# Altium footprint library SMT.PcbLib: 325 footprints (part 9 of 21)
Each footprint in its own frame and in the unit in brackets; x right, y up, seen from the top. Pads: shape width x height; smd on the part's side, far side on the other; paste and mask are expansions set on the pad; w line width, h text height; cw(c..) or ccw(c..) is an arc to the next point about the centre after c.
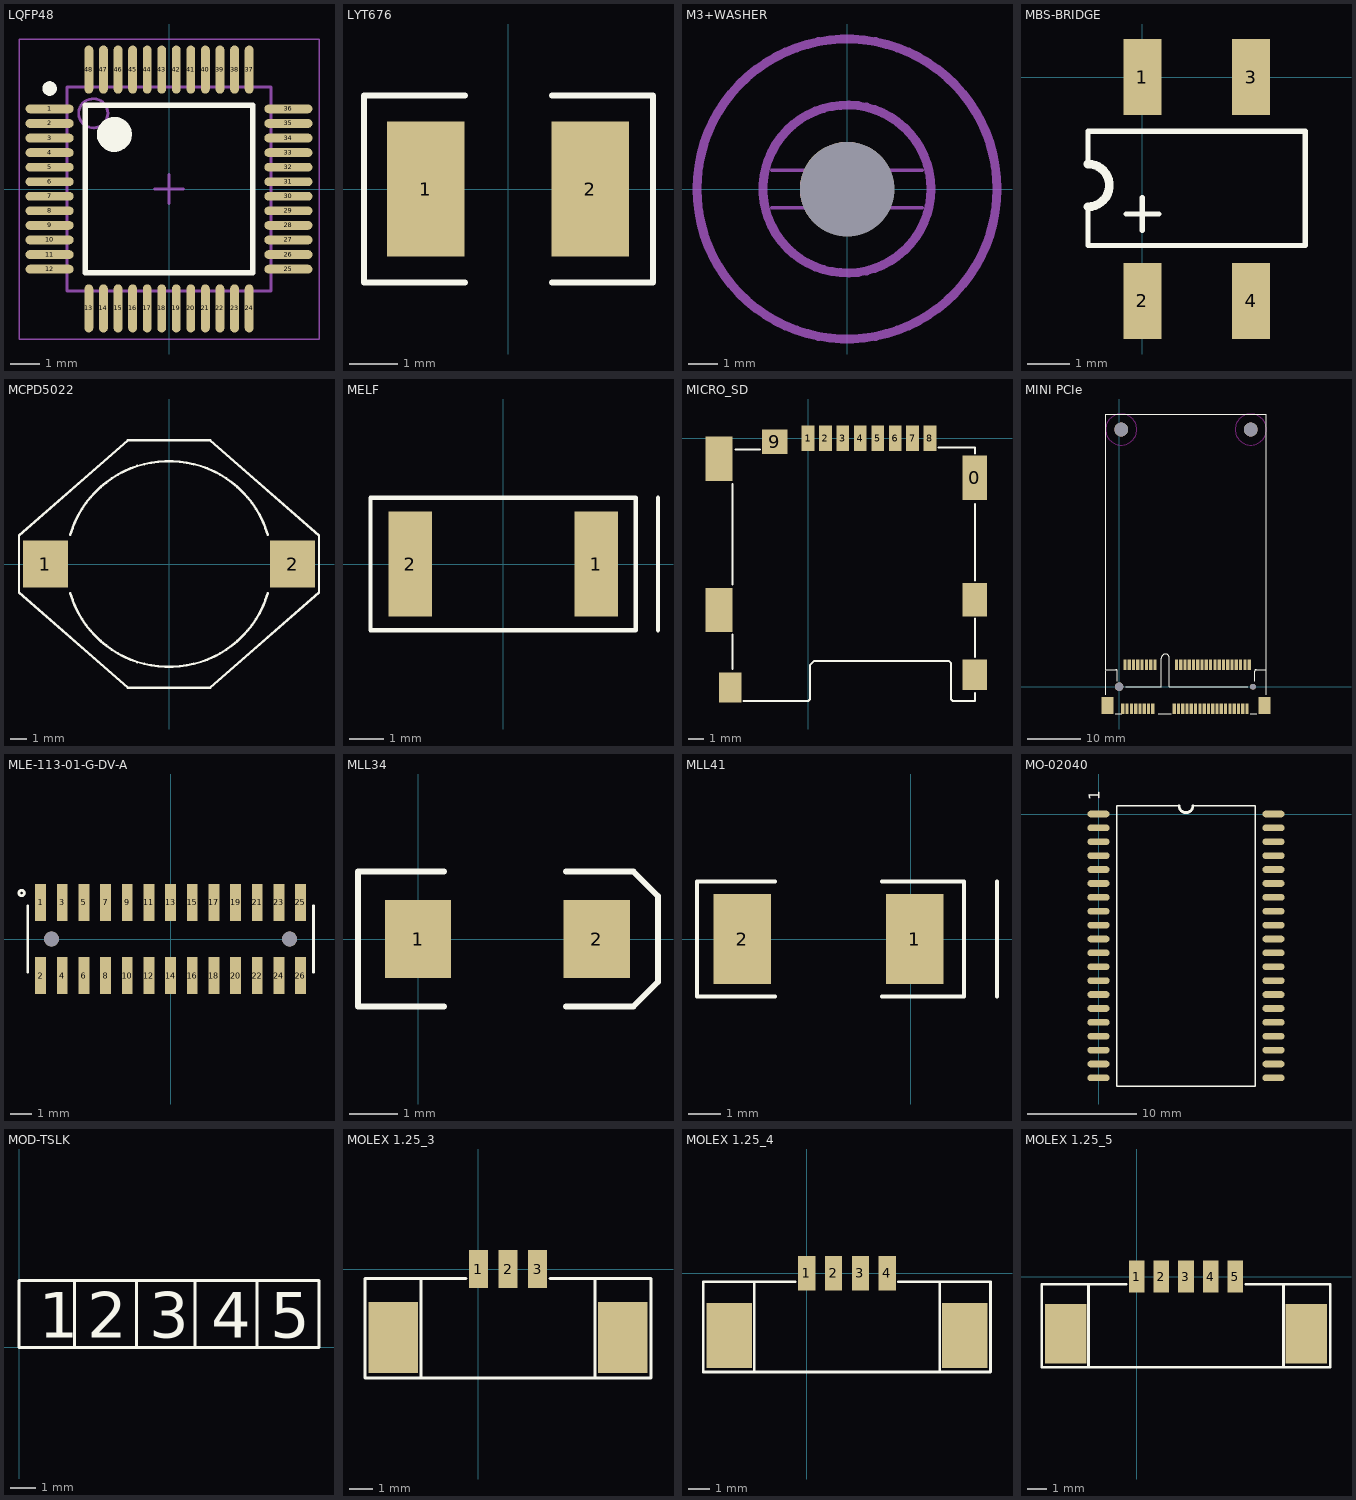
[diagram p8: the footprints below, top view; thin cyan lines are the x and y axes]

## LQFP48 [mm] "TSQFP, 48-Leads, Body 7.00x7.00mm, Pitch 0.50mm, IPC Medium Density"
height 1.5
pads (48):
  oval 1.65x0.3 smd: 1(-4.1,2.75) 2(-4.1,2.25) 3(-4.1,1.75) 4(-4.1,1.25) 5(-4.1,0.75) 6(-4.1,0.25) 7(-4.1,-0.25) 8(-4.1,-0.75) 9(-4.1,-1.25) 10(-4.1,-1.75) 11(-4.1,-2.25) 12(-4.1,-2.75) 25(4.1,-2.75) 26(4.1,-2.25) 27(4.1,-1.75) 28(4.1,-1.25) 29(4.1,-0.75) 30(4.1,-0.25) 31(4.1,0.25) 32(4.1,0.75) 33(4.1,1.25) 34(4.1,1.75) 35(4.1,2.25) 36(4.1,2.75)
  oval 0.3x1.65 smd: 13(-2.75,-4.1) 14(-2.25,-4.1) 15(-1.75,-4.1) 16(-1.25,-4.1) 17(-0.75,-4.1) 18(-0.25,-4.1) 19(0.25,-4.1) 20(0.75,-4.1) 21(1.25,-4.1) 22(1.75,-4.1) 23(2.25,-4.1) 24(2.75,-4.1) 37(2.75,4.1) 38(2.25,4.1) 39(1.75,4.1) 40(1.25,4.1) 41(0.75,4.1) 42(0.25,4.1) 43(-0.25,4.1) 44(-0.75,4.1) 45(-1.25,4.1) 46(-1.75,4.1) 47(-2.25,4.1) 48(-2.75,4.1)
TopOverlay:
  circle w0.6: c-1.875,1.875 r0.3
  circle w0.25: c-4.1,3.45 r0.125
  lines w0.2: -2.875,-2.875 2.875,-2.875 2.875,2.875 -2.875,2.875 -2.875,-2.875
Mechanical13:
  circle w0.1: c-2.6,2.6 r0.5
  lines w0.1: -3.5,-3.5 3.5,-3.5 3.5,3.5 -3.5,3.5 -3.5,-3.5
Mechanical15:
  lines w0.05: -5.15,-5.15 5.15,-5.15 5.15,5.15 -5.15,5.15 -5.15,-5.15
  lines w0.1: -0.5,0 0.5,0 ; 0,-0.5 0,0.5
3D body: height 1.5, standoff 0.05, extent -3.5,-3.5 3.5,3.5

## LYT676 [mil]
pads (2):
  rect 63x110 smd: 1(-67,0) 2(67,0)
TopOverlay:
  lines w5: -35,-76 -117,-76 -117,76 -35,76 ; 36,-76 118,-76 118,76 36,76

## M3+WASHER [mil]
pads (1):
  round 126 hole 126: ""(0,0)
Mechanical2:
  circle w12: c0,0 r112
  circle w12: c0,0 r200
  lines w5: -100,-25 100,-25 ; -100,25 100,25
  text "M3+WASHER" at -238,-275 h52

## MBS-BRIDGE [mil]
pads (4):
  rect 35x70 smd: 1(0,0) 2(0,-206) 3(100,0) 4(100,-206)
TopOverlay:
  lines w5: -50,-120 -50,-155 150,-155 150,-50 -50,-50 -50,-81 ; -15,-126 15,-126 ; 0,-141 0,-111
  lines w8: -50,-119.37 ccw(c-50,-99.69) -50,-80

## MCPD5022 [mm] "INDUCTOR FOOT PRINT"
height 7.11
pads (2):
  rect 2.79x2.92 smd: 1(-7.62,0) 2(7.62,0)
TopOverlay:
  lines w0.152: -6.086,-1.813 ccw(c0,0) 6.086,-1.811 ; -6.086,1.813 cw(c0,0) 6.086,1.811 ; -9.25,-1.75 -9.25,0 -9.25,1.75 -2.54,7.62 0,7.62 2.54,7.62 9.25,1.75 9.25,0 9.25,-1.75 2.54,-7.62 0,-7.62 -2.54,-7.62 -9.25,-1.75

## MELF [mm] "SMALL SIGNAL SCHOTTKY DIODES"
height 2.65
pads (2):
  rect 1.25x3 smd: 1(2.667,0) 2(-2.667,0)
TopOverlay:
  lines w0.125: 3.81,-1.905 -3.81,-1.905 -3.81,1.905 3.81,1.905
  lines w0.127: 3.81,-1.905 3.81,1.905 ; 4.445,-1.905 4.445,1.905

## MICRO_SD [mm]
pads (15):
  rect 1.55x2.8 smd: 0(10.535,-2.499)
  rect 0.8x1.6 smd: 1(0,0) 2(1.1,0) 3(2.2,0) 4(3.3,0) 5(4.4,0) 6(5.5,0) 7(6.6,0) 8(7.7,0)
  rect 1.6x1.55 smd: 9(-2.105,-0.229)
  rect 1.7x2.8 smd: ""(-5.613,-10.849) ""(-5.613,-1.299)
  rect 1.4x1.9 smd: ""(-4.915,-15.742)
  rect 1.55x1.9 smd: ""(10.535,-14.943)
  rect 1.55x2.1 smd: ""(10.535,-10.199)
TopOverlay:
  lines w0.127: -4.765,-14.567 -4.765,-12.408 ; -4.765,-9.233 -4.765,-2.883 ; -4.572,-0.724 -3.048,-0.724 ; -4.064,-16.6 0,-16.6 0.127,-16.473 0.127,-14.313 0.381,-14.059 8.89,-14.059 9.017,-14.186 9.017,-16.473 9.144,-16.6 10.536,-16.6 10.541,-16.595 10.541,-16.091 ; 8.255,-0.597 10.541,-0.597 10.541,-0.978 ; 10.541,-13.805 10.541,-11.392 ; 10.541,-8.979 10.541,-4.153

## MINI PCIe [mm] "P/N 67910-0002"
height 4
pads (58):
  rect 0.6x2 smd: 1(0.7,-4.1) 2(1.1,4.1) 3(1.5,-4.1) 4(1.9,4.1) 5(2.3,-4.1) 6(2.7,4.1) 7(3.1,-4.1) 8(3.5,4.1) 9(3.9,-4.1) 10(4.3,4.1) 11(4.7,-4.1) 12(5.1,4.1) 13(5.5,-4.1) 14(5.9,4.1) 15(6.3,-4.1) 16(6.7,4.1) 17(10.3,-4.1) 18(10.7,4.1) 19(11.1,-4.1) 20(11.5,4.1) 21(11.9,-4.1) 22(12.3,4.1) 23(12.7,-4.1) 24(13.1,4.1) 25(13.5,-4.1) 26(13.9,4.1) 27(14.3,-4.1) 28(14.7,4.1) 29(15.1,-4.1) 30(15.5,4.1) 31(15.9,-4.1) 32(16.3,4.1) 33(16.7,-4.1) 34(17.1,4.1) 35(17.5,-4.1) 36(17.9,4.1) 37(18.3,-4.1) 38(18.7,4.1) 39(19.1,-4.1) 40(19.5,4.1) 41(19.9,-4.1) 42(20.3,4.1) 43(20.7,-4.1) 44(21.1,4.1) 45(21.5,-4.1) 46(21.9,4.1) 47(22.3,-4.1) 48(22.7,4.1) 49(23.1,-4.1) 50(23.5,4.1) 51(23.9,-4.1) 52(24.3,4.1)
  rect 2.3x3.2 smd: ""(-2.15,-3.5) ""(27.15,-3.5)
  round 1.6 hole 1.6 unplated: ""(0,0)
  round 2.6 hole 2.6 unplated: ""(0.4,48.05) ""(24.6,48.05)
  round 1.1 hole 1.1 unplated: ""(25,0)
TopOverlay:
  lines w0.152: -2.5,-1.5 -2.5,-1 -2.5,3 ; -0.7,-5.1 0.5,-5.1 ; -0.35,1.05 -0.35,2.9 ccw(c-0.65,2.9) -0.65,3.2 -2.5,3.2 -2.5,50.95 27.5,50.95 27.5,3.2 25.65,3.2 ccw(c25.65,2.9) 25.35,2.9 25.35,1.05 ; 1.2,0 7.9,0 7.9,5.35 cw(c8.65,5.35) 9.4,5.35 9.4,0 24,0 ; 7.3,-5.1 9.7,-5.1 ; 24.5,-5.1 25.7,-5.1 ; 27.5,-1.5 27.5,-1 27.5,3
KeepOutLayer:
  circle w0.152: c24.6,48.05 r2.9
  circle w0.152: c0.4,48.05 r2.9

## MLE-113-01-G-DV-A [mm] "Samtec"
height 3.5
pads (28):
  rect 0.5x1.709 smd: 1(-6,1.686) 2(-6,-1.686) 3(-5,1.686) 4(-5,-1.686) 5(-4,1.686) 6(-4,-1.686) 7(-3,1.686) 8(-3,-1.686) 9(-2,1.686) 10(-2,-1.686) 11(-1,1.686) 12(-1,-1.686) 13(0,1.686) 14(0,-1.686) 15(1,1.686) 16(1,-1.686) 17(2,1.686) 18(2,-1.686) 19(3,1.686) 20(3,-1.686) 21(4,1.686) 22(4,-1.686) 23(5,1.686) 24(5,-1.686) 25(6,1.686) 26(6,-1.686)
  round 0.69 hole 0.69 unplated: ""(-5.5,0) ""(5.5,0)
TopOverlay:
  circle w0.127: c-6.875,2.125 r0.125
  lines w0.127: -6.6,-1.535 -6.6,0 -6.6,1.535 ; 6.6,-1.535 6.6,0 6.6,1.535
3D body: height 8.06, standoff -3.63, extent -5.5,0 -5.5,0
3D body "MLE-113-01-G-DV-A.stp": height 3.3, standoff -0.71, extent -6.601,-2.159 6.602,2.159

## MLL34 [mil]
pads (2):
  rect 54x64 smd: 1(0,0) 2(146,0)
TopOverlay:
  lines w5: 21,-55 -49,-55 -49,55 21,55 ; 121,-55 176,-55 196,-35 196,35 176,55 121,55

## MLL41 [mil]
pads (2):
  rect 70x110 smd: 1(5,0) 2(-205,0)
TopOverlay:
  lines w5: -165,-70 -260,-70 -260,70 -165,70 ; -35,-70 65,-70 65,70 -35,70 ; 105,-70 105,70

## MO-02040 [mil]
pads (40):
  oval 80x24 smd: 1(0,0) 2(0,-50) 3(0,-100) 4(0,-150) 5(0,-200) 6(0,-250) 7(0,-300) 8(0,-350) 9(0,-400) 10(0,-450) 11(0,-500) 12(0,-550) 13(0,-600) 14(0,-650) 15(0,-700) 16(0,-750) 17(0,-800) 18(0,-850) 19(0,-900) 20(0,-950) 21(630,-950) 22(630,-900) 23(630,-850) 24(630,-800) 25(630,-750) 26(630,-700) 27(630,-650) 28(630,-600) 29(630,-550) 30(630,-500) 31(630,-450) 32(630,-400) 33(630,-350) 34(630,-300) 35(630,-250) 36(630,-200) 37(630,-150) 38(630,-100) 39(630,-50) 40(630,0)
TopOverlay:
  lines w5: 290,30 65,30 65,-980 565,-980 565,30 340,30
  lines w10: 290,30 ccw(c315,30) 340,30
  text "1" at 5,50 h40

## MOD-TSLK [mm]
TopOverlay:
  lines w0.127: 2.159,0 2.159,2.54 ; 4.572,0 4.572,2.54 ; 6.858,0 6.858,2.54 ; 9.271,0 9.271,2.54 ; 0,0 11.684,0 11.684,2.603 0,2.603 0,0
  text "1" at 0.762,0.381 h1.78
  text "2" at 2.667,0.381 h1.78
  text "3" at 5.08,0.381 h1.78
  text "4" at 7.493,0.381 h1.78
  text "5" at 9.779,0.381 h1.78

## MOLEX 1.25_3 [mm]
pads (5):
  rect 0.8x1.6 smd: 1(0,0) 2(1.25,0) 3(2.5,0)
  rect 2.1x3 smd: ""(-3.6,-2.9) ""(6.1,-2.9)
TopOverlay:
  lines w0.127: -2.44,-4.59 -2.44,-0.4 ; -0.53,-0.4 -4.81,-0.4 -4.81,-4.6 7.3,-4.6 7.3,-0.4 3.02,-0.4 ; 4.94,-4.59 4.94,-0.4

## MOLEX 1.25_4 [mm]
pads (6):
  rect 0.8x1.6 smd: 1(0,0) 2(1.25,0) 3(2.5,0) 4(3.75,0)
  rect 2.1x3 smd: ""(-3.6,-2.9) ""(7.35,-2.9)
TopOverlay:
  lines w0.127: -2.44,-4.59 -2.44,-0.4 ; -0.53,-0.4 -4.81,-0.4 -4.81,-4.6 8.55,-4.6 8.55,-0.4 4.27,-0.4 ; 6.19,-4.59 6.19,-0.4

## MOLEX 1.25_5 [mm]
pads (7):
  rect 0.8x1.6 smd: 1(0,0) 2(1.25,0) 3(2.5,0) 4(3.75,0) 5(5,0)
  rect 2.1x3 smd: ""(-3.6,-2.9) ""(8.6,-2.9)
TopOverlay:
  lines w0.127: -2.44,-4.59 -2.44,-0.4 ; -0.53,-0.4 -4.81,-0.4 -4.81,-4.6 9.8,-4.6 9.8,-0.4 5.52,-0.4 ; 7.44,-4.59 7.44,-0.4